# Altium footprint library 逸芬的库鸭.PcbLib: 255 footprints (part 16 of 20)
Each footprint in its own frame and in the unit in brackets; x right, y up, seen from the top. Pads: shape width x height; smd on the part's side, far side on the other; paste and mask are expansions set on the pad; w line width, h text height; cw(c..) or ccw(c..) is an arc to the next point about the centre after c.
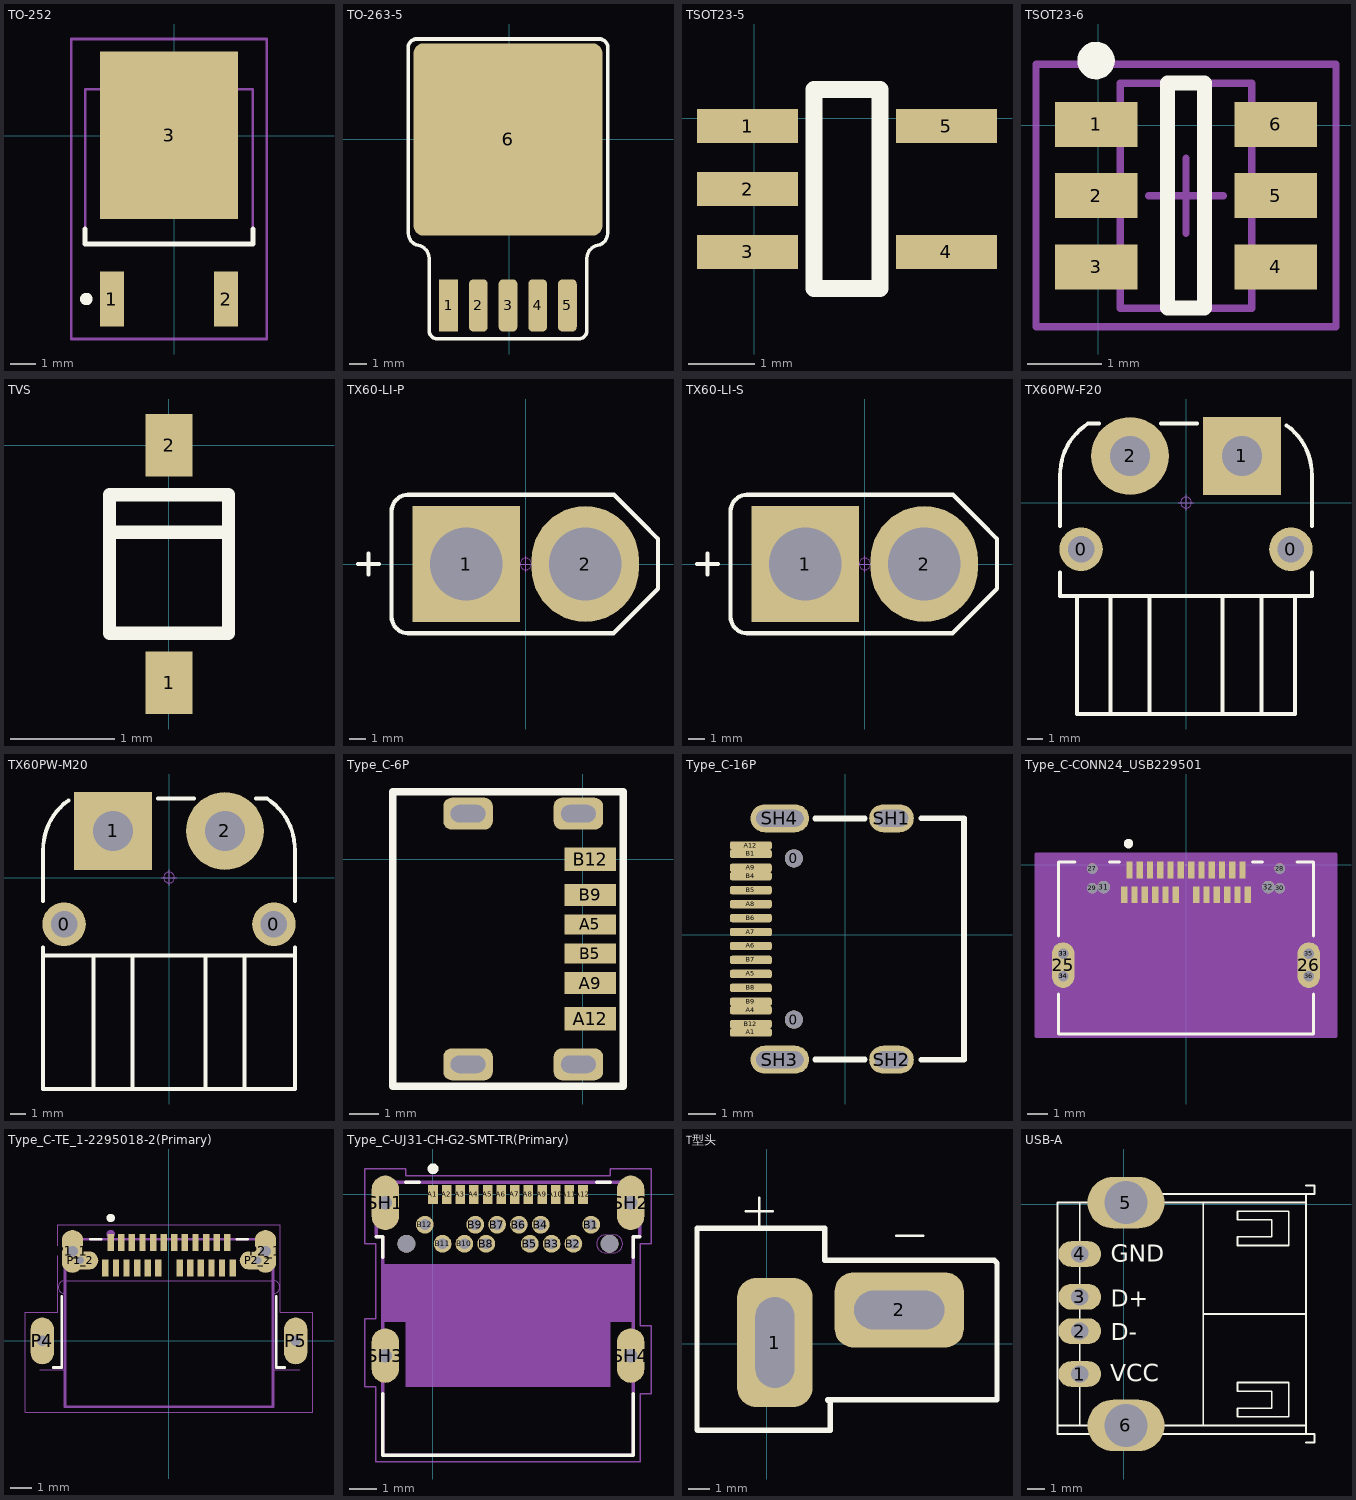
[diagram p15: the footprints below, top view; thin cyan lines are the x and y axes]

## TO-252 [mm] "MOS"
pads (3):
  rect 0.95x2.2 smd: 1(-2.483,-6.534) 2(2.077,-6.534)
  rect 5.5x6.7 smd: 3(-0.203,0.016)
Top Overlay:
  circle w0.25: c-3.508,-6.534 r0.125
  lines w0.2: -3.553,-3.734 -3.553,-4.334 3.147,-4.334 3.147,-3.734
Mechanical 13:
  lines w0.1: -3.553,-4.334 3.147,-4.334 3.147,1.866 -3.553,1.866 -3.553,-4.334
Mechanical 15:
  lines w0.1: -0.703,-2.134 0.297,-2.134 ; -0.203,-2.634 -0.203,-1.634 ; -4.103,-8.134 3.697,-8.134 3.697,3.866 -4.103,3.866 -4.103,-8.134
3D body "User Library-DPAK-1.STEP": height 2.39, standoff -0.02, extent -3.473,-7.034 3.067,2.905

## TO-263-5 [mm]
pads (6):
  rect 1.07x3 smd: 1(-3.47,-9.503)
  rrect50% 1.07x3 smd: 2(-1.77,-9.503) 3(-0.07,-9.503) 4(1.63,-9.503) 5(3.33,-9.503)
  rrect10% 10.8x11 smd: 6(-0.07,-0.003)
Top Overlay:
  lines w0.2: -4.582,-10.875 ccw(c-4.097,-10.934) -4.195,-11.412 ; 4.055,-11.412 ccw(c3.958,-10.934) 4.442,-10.875
  lines w0.203: -5.77,5.297 -5.77,-5.283 ccw(c-5.075,-5.368) -5.215,-6.054 cw(c-5.376,-6.838) -4.582,-6.935 -4.582,-10.875 ; -5.77,5.356 cw(c-5.292,5.258) -5.369,5.74 ; -5.37,5.747 5.23,5.747 ; -4.195,-11.412 4.055,-11.412 ; 4.442,-10.875 4.442,-6.935 cw(c5.236,-6.838) 5.076,-6.054 ccw(c4.935,-5.368) 5.63,-5.283 5.63,5.297 ; 5.229,5.74 cw(c5.152,5.258) 5.63,5.356
3D body: height 4.48, standoff 0, extent -5.207,-9.554 5.017,4.797

## TSOT23-5 [mil]
pads (5):
  rect 60x20 smd: 1(-4.06,-4.53) 2(-4.06,-41.93) 3(-4.06,-79.33) 4(114.06,-79.33) 5(114.06,-4.53)
Top Overlay:
  lines w10: 35.31,-100.98 35.31,17.13 74.69,17.13 74.69,-100.98 35.31,-100.98
3D body: height 47.24, standoff 0, extent 1,-98.09 111.23,16.09

## TSOT23-6 [mm]
pads (6):
  rect 1.1x0.6 smd: 1(-0.032,0.01) 2(-0.032,-0.94) 3(-0.032,-1.89) 4(2.368,-1.89) 5(2.368,-0.94) 6(2.368,0.01)
Top Overlay:
  circle w0.25: c-0.032,0.86 r0.125
  lines w0.2: 0.918,-2.44 1.418,-2.44 1.418,0.56 0.918,0.56 0.918,-2.44
Mechanical 13:
  lines w0.1: 0.293,-2.44 0.293,0.56 2.043,0.56 2.043,-2.44 0.293,-2.44
Mechanical 15:
  lines w0.1: 0.668,-0.94 1.668,-0.94 ; 1.168,-1.44 1.168,-0.44 ; -0.832,-2.69 -0.832,0.81 3.168,0.81 3.168,-2.69 -0.832,-2.69
3D body: height 1.45, standoff 0, extent 0.293,-2.44 2.043,0.56

## TVS [mm]
pads (2):
  rect 0.45x0.6 smd: 1(0.003,-2.286) 2(0.003,0)
Top Overlay:
  lines w0.127: -0.555,-0.838 0.562,-0.838 ; -0.57,-1.809 0.576,-1.809 0.576,-0.477 -0.57,-0.477 -0.57,-1.809
3D body "SOD-323.STEP": height 1, standoff 0, extent -0.65,-2.45 0.65,0.15

## TX60-LI-P [mm] "长：16mm，宽：8.2mm，高：16mm"
pads (2):
  rect 6.5x7 hole 4.4: 1(-3.6,0)
  oval 6.5x7 hole 4.4: 2(3.6,0)
Top Overlay:
  lines w0.254: -10.16,0 -8.89,0 ; -9.525,-0.635 -9.525,0.635 ; -8.128,-3.191 ccw(c-7.128,-3.191) -7.128,-4.191 5.309,-4.191 8,-1.5 8,1.525 6.985,2.54 5.334,4.191 -7.128,4.191 ccw(c-7.128,3.191) -8.128,3.191 -8.128,-3.191
Mechanical 15:
  circle w0.05: c0,0 r0.35
  lines w0.05: -0.5,0 0.5,0 ; 0,-0.5 0,0.5
3D body "TX60-LI-P.STEP": height 15.85, standoff -2.25, extent -8,-4.1 8,4.1

## TX60-LI-S [mm] "长：16mm，宽：8.2mm，高：16mm"
pads (2):
  rect 6.5x7 hole 4.4: 1(-3.6,0)
  oval 6.5x7 hole 4.4: 2(3.6,0)
Top Overlay:
  lines w0.254: -10.16,0 -8.89,0 ; -9.525,-0.635 -9.525,0.635 ; -8.128,-3.191 ccw(c-7.128,-3.191) -7.128,-4.191 5.309,-4.191 8,-1.5 8,1.525 6.985,2.54 5.334,4.191 -7.128,4.191 ccw(c-7.128,3.191) -8.128,3.191 -8.128,-3.191
Mechanical 15:
  circle w0.05: c0,0 r0.35
  lines w0.05: -0.5,0 0.5,0 ; 0,-0.5 0,0.5
3D body "TX60-LI-S.STEP": height 16.05, standoff -2.25, extent -8,-4.1 8,4.1

## TX60PW-F20 [mm] "长：18.8mm， 宽：16mm，高：8.6mm"
pads (4):
  round 2.8 hole 1.7: 0(-6.75,-3) 0(6.75,-3)
  rect 5x5 hole 2.6: 1(3.6,3)
  round 5 hole 2.6: 2(-3.6,3)
Top Overlay:
  lines w0.254: -8.1,-4.5 -8.1,-6 8.1,-6 8.1,-4.5 ; -8.1,-1.5 -8.1,1.738 cw(c-4.2,1.8) -6.294,5.091 ; -7,-6 -7,-13.6 7,-13.6 7,-6 ; -6.294,5.1 -5.6,5.1 ; -4.85,-13.6 -4.85,-6 ; -2.35,-13.6 -2.35,-6 ; -1.6,5.1 0.7,5.1 ; 2.35,-13.6 2.35,-6 ; 4.85,-13.6 4.85,-6 ; 6.476,4.967 cw(c4.2,1.8) 8.1,1.738 ; 8.1,-1.5 8.1,1.792 ; 0,-6 ccw(c0,-6) 0,-6
Mechanical 15:
  circle w0.05: c0,0 r0.35
  lines w0.05: -0.5,0 0.5,0 ; 0,-0.5 0,0.5
3D body "TX60PW-F20.STEP": height 8.65, standoff -2.35, extent -8,-13.6 8,5.02

## TX60PW-M20 [mm] "长：18.8mm， 宽：16mm，高：8.6mm"
pads (4):
  round 2.8 hole 1.7: 0(-6.751,-3.001) 0(6.749,-3.001)
  rect 5x5 hole 2.6: 1(-3.601,2.999)
  round 5 hole 2.6: 2(3.599,2.999)
Top Overlay:
  lines w0.254: -8.101,-4.501 -8.101,-5.001 ; -8.101,-1.501 -8.101,1.791 ; -8.101,1.737 cw(c-4.201,1.799) -6.478,4.966 ; -4.851,-13.601 -4.851,-5.001 ; -2.351,-13.601 -2.351,-5.001 ; -0.701,5.099 1.599,5.099 ; 2.349,-13.601 2.349,-5.001 ; 4.849,-13.601 4.849,-5.001 ; 5.599,5.099 6.293,5.099 ; 6.293,5.09 cw(c4.199,1.799) 8.099,1.737 8.099,-1.501 ; 8.099,-4.501 8.099,-5.001 ; -8.101,-5.001 -8.101,-13.601 8.099,-13.601 8.099,-5.001 ; -8.101,-5.001 8.099,-5.001
Mechanical 15:
  circle w0.05: c-0.001,-0.001 r0.35
  lines w0.05: -0.501,-0.001 0.499,-0.001 ; -0.001,-0.501 -0.001,0.499
3D body "TX60PW-M20.STEP": height 8.65, standoff -2.35, extent -8.001,-13.601 7.999,5.019

## Type_C-6P [mm]
pads (10):
  rect 1.778x0.7 smd: A5(0.254,-2.25) B5(0.254,-3.25)
  rect 1.778x0.76 smd: A9(0.254,-4.27) B9(0.254,-1.23)
  rect 1.778x0.8 smd: A12(0.254,-5.5) B12(0.254,0)
  rrect50% 1.7x1.1 hole 0.6 slot 1.2 at 0 deg: ""(-3.95,-7.07) ""(-3.95,1.57) ""(-0.15,-7.07) ""(-0.15,1.57)
Top Overlay:
  lines w0.254: -6.547,-7.83 1.397,-7.83 1.397,2.33 -6.547,2.33 -6.547,-7.83
3D body "USB TYPE-C 3.1smple.STEP": height 3.18, standoff -0.9, extent -6.589,-7.22 0.311,1.72

## Type_C-16P [mm] "贴片USB-3.1  4固定插脚"
pads (22):
  round 0.65 hole 0.65: 0(-1.834,-3.045) 0(-1.834,2.735)
  rrect50% 1.5x0.3 smd: A1(-3.374,-3.505) A4(-3.374,-2.705) A5(-3.374,-1.405) A6(-3.374,-0.405) A7(-3.374,0.095) A8(-3.374,1.095) A9(-3.374,2.395) A12(-3.374,3.195) B1(-3.374,2.895) B4(-3.374,2.095) B5(-3.374,1.595) B6(-3.374,0.595) B7(-3.374,-0.905) B8(-3.374,-1.905) B9(-3.374,-2.405) B12(-3.374,-3.205)
  oval 1.6x1 hole 0.6 slot 1.2 at 0 deg: SH1(1.666,4.17) SH2(1.666,-4.48)
  oval 2.1x1 hole 0.6 slot 1.7 at 0 deg: SH3(-2.334,-4.48) SH4(-2.334,4.17)
Top Overlay:
  lines w0.203: -1.073,-4.473 0.705,-4.473 ; -1.073,4.163 0.705,4.163 ; 2.737,-4.48 4.266,-4.48 4.266,4.17 2.737,4.17
3D body "User Library-USB Type C Port (SMD Type).STEP": height 3.2, standoff -1, extent -3.394,-4.546 4.506,4.394

## Type_C-CONN24_USB229501 [mil]
pads (38):
  oval 43x87 smd: 25(-235.04,-192.52) 26(235.04,-192.52)
  round 20 hole 20: 27(-179.13,-7.68) 28(179.13,-7.68) 29(-179.13,-45.12) 30(179.13,-45.12) 33(-235.04,-171.02) 33(-235.04,-171.02) 34(-235.04,-214.02) 34(-235.04,-214.02) 35(235.04,-171.02) 36(235.04,-214.02)
  round 24 hole 24: 31(-157.48,-43.11) 32(157.48,-43.11)
  rect 12x32 smd paste+0 mask+0: A1(-108.27,-10.47) A2(-88.58,-10.47) A3(-68.9,-10.47) A4(-49.21,-10.47) A5(-29.53,-10.47) A6(-9.84,-10.47) A7(9.84,-10.47) A8(29.53,-10.47) A9(49.21,-10.47) A10(68.9,-10.47) A11(88.58,-10.47) A12(108.27,-10.47) B1(118.11,-57.72) B2(98.43,-57.72) B3(78.74,-57.72) B4(59.06,-57.72) B5(39.37,-57.72) B6(19.68,-57.72) B7(-19.68,-57.72) B8(-39.37,-57.72) B9(-59.06,-57.72) B10(-78.74,-57.72) B11(-98.43,-57.72) B12(-118.11,-57.72)
Top Overlay:
  circle w10: c-110,40 r4
  lines w6: -244,-247.94 -244,-324 244,-324 244,-247.94 ; -244,-137.1 -244,5 -212.23,5 ; -146.03,5 -127.1,5 ; 127.1,5 146.03,5 ; 212.23,5 244,5 244,-137.1
Bottom Overlay:
  circle w10: c-110,40 r4
Mechanical 13:
  circle w5: c-110,40 r4
  lines w1: -239,-319 239,-319 239,0 -239,0 -239,-319
Mechanical 15:
  region: 239,0 -239,0 -239,-319 239,-319
  region: 287,20 -287,20 -287,-329 287,-329
  lines w6: -287,-329 -287,20 287,20 287,-329 -287,-329
Multi-Layer:
  lines w1: -189.13,-45.12 -189.13,-7.68 ; -179.13,-55.12 -157.48,-55.11 ; -169.13,-7.68 -169.13,-31.11 -157.48,-31.11 ; 157.48,-55.11 179.13,-55.12 ; 157.48,-31.11 169.13,-31.11 169.13,-7.68 ; 189.13,-45.12 189.13,-7.68 ; -245.04,-214.02 -245.04,-171.02 -245.04,-214.02 ; -225.04,-214.02 -225.04,-171.02 -225.04,-214.02 ; -194,-319 -194,-91 194,-91 194,-319 -194,-319 ; 225.04,-214.02 225.04,-171.02 225.04,-214.02 ; 245.04,-214.02 245.04,-171.02 245.04,-214.02
3D body "c-2295018-2-a-3d.stp": height 96.06, standoff -45.67, extent -238.97,-315.86 238.99,2.84

## Type_C-TE_1-2295018-2(Primary) [mm]
pads (30):
  rect 0.3x0.8 smd: A1(-2.75,4.63) A2(-2.25,4.63) A3(-1.75,4.63) A4(-1.25,4.63) A5(-0.75,4.63) A6(-0.25,4.63) A7(0.25,4.63) A8(0.75,4.63) A9(1.25,4.63) A10(1.75,4.63) A11(2.25,4.63) A12(2.75,4.63) B1(3,3.43) B2(2.5,3.43) B3(2,3.43) B4(1.5,3.43) B5(1,3.43) B6(0.5,3.43) B7(-0.5,3.43) B8(-1,3.43) B9(-1.5,3.43) B10(-2,3.43) B11(-2.5,3.43) B12(-3,3.43)
  oval 1.008x2.016 hole 0.5: P1_1(-4.55,4.22) P2_1(4.55,4.22)
  oval 1.716x0.858 hole 0.35: P1_2(-4.191,3.795) P2_2(4.191,3.795)
  oval 1.1x2.2 hole 0.5: P4(-5.97,0) P5(5.97,0)
Top Overlay:
  circle w0.2: c-2.75,5.795 r0.1
  lines w0.127: -5.45,-1.25 -5.05,-1.25 -5.05,2.1 ; -3.7,4.795 -3.2,4.795 ; 3.2,4.795 3.7,4.795 ; 5.05,2.1 5.05,-1.25 5.45,-1.25
Mechanical 1:
  lines w0: -6.09,-1.36 -4.92,-1.36 -4.92,2.24 cw(c-4.92,2.54) -5.22,2.54 cw(c-4.92,2.54) -4.92,2.84 4.93,2.84 cw(c4.925,2.545) 5.22,2.54 ; -4.3,4.25 -4.3,4.695 ccw(c-4.55,4.695) -4.55,4.945 ccw(c-4.55,4.695) -4.8,4.695 -4.8,3.745 ccw(c-4.55,3.745) -4.55,3.495 -4,3.495 ccw(c-4,3.795) -3.7,3.795 ; -4.3,4.25 ccw(c-4.15,4.245) -4.155,4.095 -4.005,4.095 ; -4.002,4.095 cw(c-4.002,3.792) -3.7,3.792 ; 4.3,4.25 4.3,4.695 cw(c4.55,4.695) 4.55,4.945 cw(c4.55,4.695) 4.8,4.695 4.8,3.745 cw(c4.55,3.745) 4.55,3.495 4,3.495 cw(c4,3.795) 3.7,3.795 cw(c4,3.795) 4,4.095 4.155,4.095 ccw(c4.15,4.245) 4.3,4.25 ; 4.919,2.24 ccw(c4.929,2.531) 5.22,2.541 ; 4.92,2.24 4.92,-1.36 6.17,-1.36 ; -6.22,-0.55 ccw(c-5.97,-0.55) -5.97,-0.8 ccw(c-5.97,-0.55) -5.72,-0.55 -5.72,0.55 ccw(c-5.97,0.55) -5.97,0.8 ccw(c-5.97,0.55) -6.22,0.55 -6.22,-0.55 ; 5.72,-0.55 ccw(c5.97,-0.55) 5.97,-0.8 ccw(c5.97,-0.55) 6.22,-0.55 6.22,0.55 ccw(c5.97,0.55) 5.97,0.8 ccw(c5.97,0.55) 5.72,0.55 5.72,-0.55
Mechanical 4:
  circle w0.2: c-2.75,5.035 r0.1
  circle w0.2: c-2.75,5.035 r0.1
  lines w0.127: -4.9,-3.105 -4.9,4.795 ; -4.9,-3.105 4.9,-3.105 ; -4.9,-3.105 -4.9,4.795 ; -4.9,-3.105 4.9,-3.105 ; -4.9,4.795 4.9,4.795 ; -4.9,4.795 4.9,4.795 ; 4.9,-3.105 4.9,4.795 ; 4.9,-3.105 4.9,4.795
Mechanical 16:
  lines w0.05: -6.77,-3.355 -6.77,1.35 -5.25,1.35 -5.25,5.48 5.25,5.48 5.25,1.35 6.77,1.35 6.77,-3.355 -6.77,-3.355
3D body "c-1-2295018-2-a-3d.stp": height 2.5, standoff -1.1, extent -6.07,-3.142 6.07,4.953

## Type_C-UJ31-CH-G2-SMT-TR(Primary) [mm]
pads (30):
  rect 0.35x0.7 smd: A1(0,0) A2(0.5,0) A3(1,0) A4(1.5,0) A5(2,0) A6(2.5,0) A7(3,0) A8(3.5,0) A9(4,0) A10(4.5,0) A11(5,0) A12(5.5,0)
  round 0.65 hole 0.4: B1(5.8,-1.11) B2(5.15,-1.81) B3(4.35,-1.81) B4(3.95,-1.11) B5(3.55,-1.81) B6(3.15,-1.11) B7(2.35,-1.11) B8(1.95,-1.81) B9(1.55,-1.11) B10(1.15,-1.81) B11(0.35,-1.81) B12(-0.3,-1.11)
  round 0.65 hole 0.65 unplated: None(-0.975,-1.81) None(6.475,-1.81)
  oval 1x2 hole 0.5: SH1(-1.75,-0.31) SH2(7.25,-0.31) SH3(-1.75,-5.91) SH4(7.25,-5.91)
Top Overlay:
  circle w0.2: c0,0.94 r0.1
  lines w0.127: -2.075,-1.56 -1.85,-1.56 -1.85,-2.31 ; -1.85,-7.31 -1.85,-9.56 7.35,-9.56 7.35,-7.31 ; -1,0.44 -0.5,0.44 ; 6,0.44 6.5,0.44 ; 7.35,-2.31 7.35,-1.56 7.575,-1.56
Mechanical 1:
  lines w0: -2,-6.31 ccw(c-1.75,-6.31) -1.5,-6.31 -1.5,-5.51 ccw(c-1.75,-5.51) -2,-5.51 -2,-6.31 ; -2,-0.61 ccw(c-1.75,-0.61) -1.5,-0.61 -1.5,-0.01 ccw(c-1.75,-0.01) -2,-0.01 -2,-0.61 ; 6.325,-2.135 cw(c6.325,-1.81) 6.325,-1.485 6.625,-1.485 cw(c6.625,-1.81) 6.625,-2.135 6.325,-2.135 ; 7,-6.31 ccw(c7.25,-6.31) 7.5,-6.31 7.5,-5.51 ccw(c7.25,-5.51) 7,-5.51 7,-6.31 ; 7,-0.61 ccw(c7.25,-0.61) 7.5,-0.61 7.5,-0.01 ccw(c7.25,-0.01) 7,-0.01 7,-0.61
Mechanical 4:
  region: -1.85,-2.56 7.35,-2.56 7.35,-4.66 6.5,-4.66 6.5,-7.06 -1,-7.06 -1,-4.66 -1.85,-4.66
  region: -1.85,-2.56 7.35,-2.56 7.35,-4.66 6.5,-4.66 6.5,-7.06 -1,-7.06 -1,-4.66 -1.85,-4.66
  region: -1.85,-2.56 7.35,-2.56 7.35,-4.66 6.5,-4.66 6.5,-7.06 -1,-7.06 -1,-4.66 -1.85,-4.66
  region: -1.85,-2.56 7.35,-2.56 7.35,-4.66 6.5,-4.66 6.5,-7.06 -1,-7.06 -1,-4.66 -1.85,-4.66
  lines w0.127: -2.075,-1.56 -2.075,0.44 ; -2.075,-1.56 -1.85,-1.56 ; -2.075,-1.56 -2.075,0.44 ; -2.075,-1.56 -1.85,-1.56 ; -2.075,0.44 7.575,0.44 ; -2.075,0.44 7.575,0.44 ; -1.85,-9.56 -1.85,-1.56 ; -1.85,-9.56 7.35,-9.56 ; -1.85,-9.56 -1.85,-1.56 ; -1.85,-9.56 7.35,-9.56 ; 7.35,-9.56 7.35,-1.56 ; 7.35,-9.56 7.35,-1.56 ; 7.35,-1.56 7.575,-1.56 ; 7.35,-1.56 7.575,-1.56 ; 7.575,-1.56 7.575,0.44 ; 7.575,-1.56 7.575,0.44
Mechanical 16:
  lines w0.05: -2.5,-7.06 -2.5,-4.56 -2.1,-4.56 -2.1,-1.81 -2.5,-1.81 -2.5,0.94 -1,0.94 -1,0.69 6.5,0.69 6.5,0.94 8,0.94 8,-1.81 7.6,-1.81 7.6,-4.81 8,-4.81 8,-7.31 7.6,-7.31 7.6,-9.81 -2.1,-9.81 -2.1,-7.06 -2.5,-7.06
3D body "CUI_UJ31-CH-G2-SMT-TR.step": height 4.5, standoff -1.16, extent -2.062,-9.612 7.65,0.388

## T型头 [mm]
pads (2):
  rrect50% 3.5x6 hole 1.8 slot 4.2 at 90 deg: 1(0.373,0.053)
  rrect50% 6x3.5 hole 1.8 slot 4.2 at 0 deg: 2(6.157,1.566)
Top Overlay:
  lines w0.1: -0.986,6.154 0.284,6.154 ; -0.351,5.519 -0.351,6.789 ; 5.999,5.011 7.269,5.011
  lines w0.254: -3.243,-4.006 -3.243,5.366 2.697,5.366 2.697,3.868 10.571,3.868 10.698,3.741 10.698,-2.609 2.824,-2.609 2.951,-2.736 2.951,-4.034 -3.215,-4.034 -3.243,-4.006
3D body "User Library-Deans.step": height 14.1, standoff -4.9, extent -2.665,-3.157 9.335,4.143

## USB-A [mm]
pads (6):
  oval 2.5x1.5 hole 1: 1(-2.569,-9.89) 2(-2.569,-7.39) 3(-2.569,-5.39) 4(-2.569,-2.89)
  oval 4.5x3 hole 2.5: 5(0.131,0.11) 6(0.131,-12.89)
Top Overlay:
  lines w0.1: -3.869,-12.89 0.131,-12.89 ; -2.569,-12.89 -2.569,0.11 ; -0.869,0.61 10.631,0.61 ; 0.131,-13.39 0.131,-12.89 ; 0.131,0.61 0.131,0.11 10.631,0.11 -2.569,0.11 ; 4.631,-12.89 4.631,0.11 ; 4.631,-6.39 10.631,-6.39 10.631,0.61 ; 10.631,-13.89 11.131,-13.89 11.131,-13.39 10.631,-13.39 ; 10.631,-12.89 0.131,-12.89 ; 10.631,1.11 11.131,1.11 11.131,0.61 10.631,0.61 ; -2.569,0.11 -3.869,0.11 -3.869,-6.39 -3.869,-13.39 10.631,-13.39 ; 10.631,-13.39 10.631,0.61 ; 6.631,-12.39 6.631,-11.89 8.631,-11.89 8.631,-10.89 6.631,-10.89 6.631,-10.39 9.631,-10.39 9.631,-11.89 9.631,-12.39 6.631,-12.39 ; 6.631,-2.39 6.631,-1.89 8.631,-1.89 8.631,-0.89 6.631,-0.89 6.631,-0.39 9.631,-0.39 9.631,-1.89 9.631,-2.39 6.631,-2.39
  text "VCC" at -0.8,-10.325 h1
  text "GND" at -0.75,-3.35 h1
  text "D+" at -0.75,-5.975 h1
  text "D-" at -0.75,-7.925 h1
Bottom Overlay:
  lines w0.1: -3.869,-12.89 10.631,-12.89 ; -2.569,-12.89 -2.569,0.11 ; 4.631,-6.39 10.631,-6.39 ; 10.631,-13.89 11.131,-13.89 11.131,-13.39 -3.869,-13.39 -3.869,0.11 ; 10.631,-13.39 10.631,-12.89 ; 10.631,1.11 11.131,1.11 11.131,0.61 10.631,0.61 ; -3.869,0.11 -3.869,0.61 10.631,0.61 ; -3.869,0.11 10.631,0.11 10.631,0.61 ; 10.631,-12.89 10.631,0.61
3D body "USB-A_SA.STEP": height 6.8, standoff -4.31, extent -3.325,-13.742 10.98,0.942